# Altium footprint library PCBLIB.PcbLib: 775 footprints (part 10 of 49)
Each footprint in its own frame and in the unit in brackets; x right, y up, seen from the top. Pads: shape width x height; smd on the part's side, far side on the other; paste and mask are expansions set on the pad; w line width, h text height; cw(c..) or ccw(c..) is an arc to the next point about the centre after c.
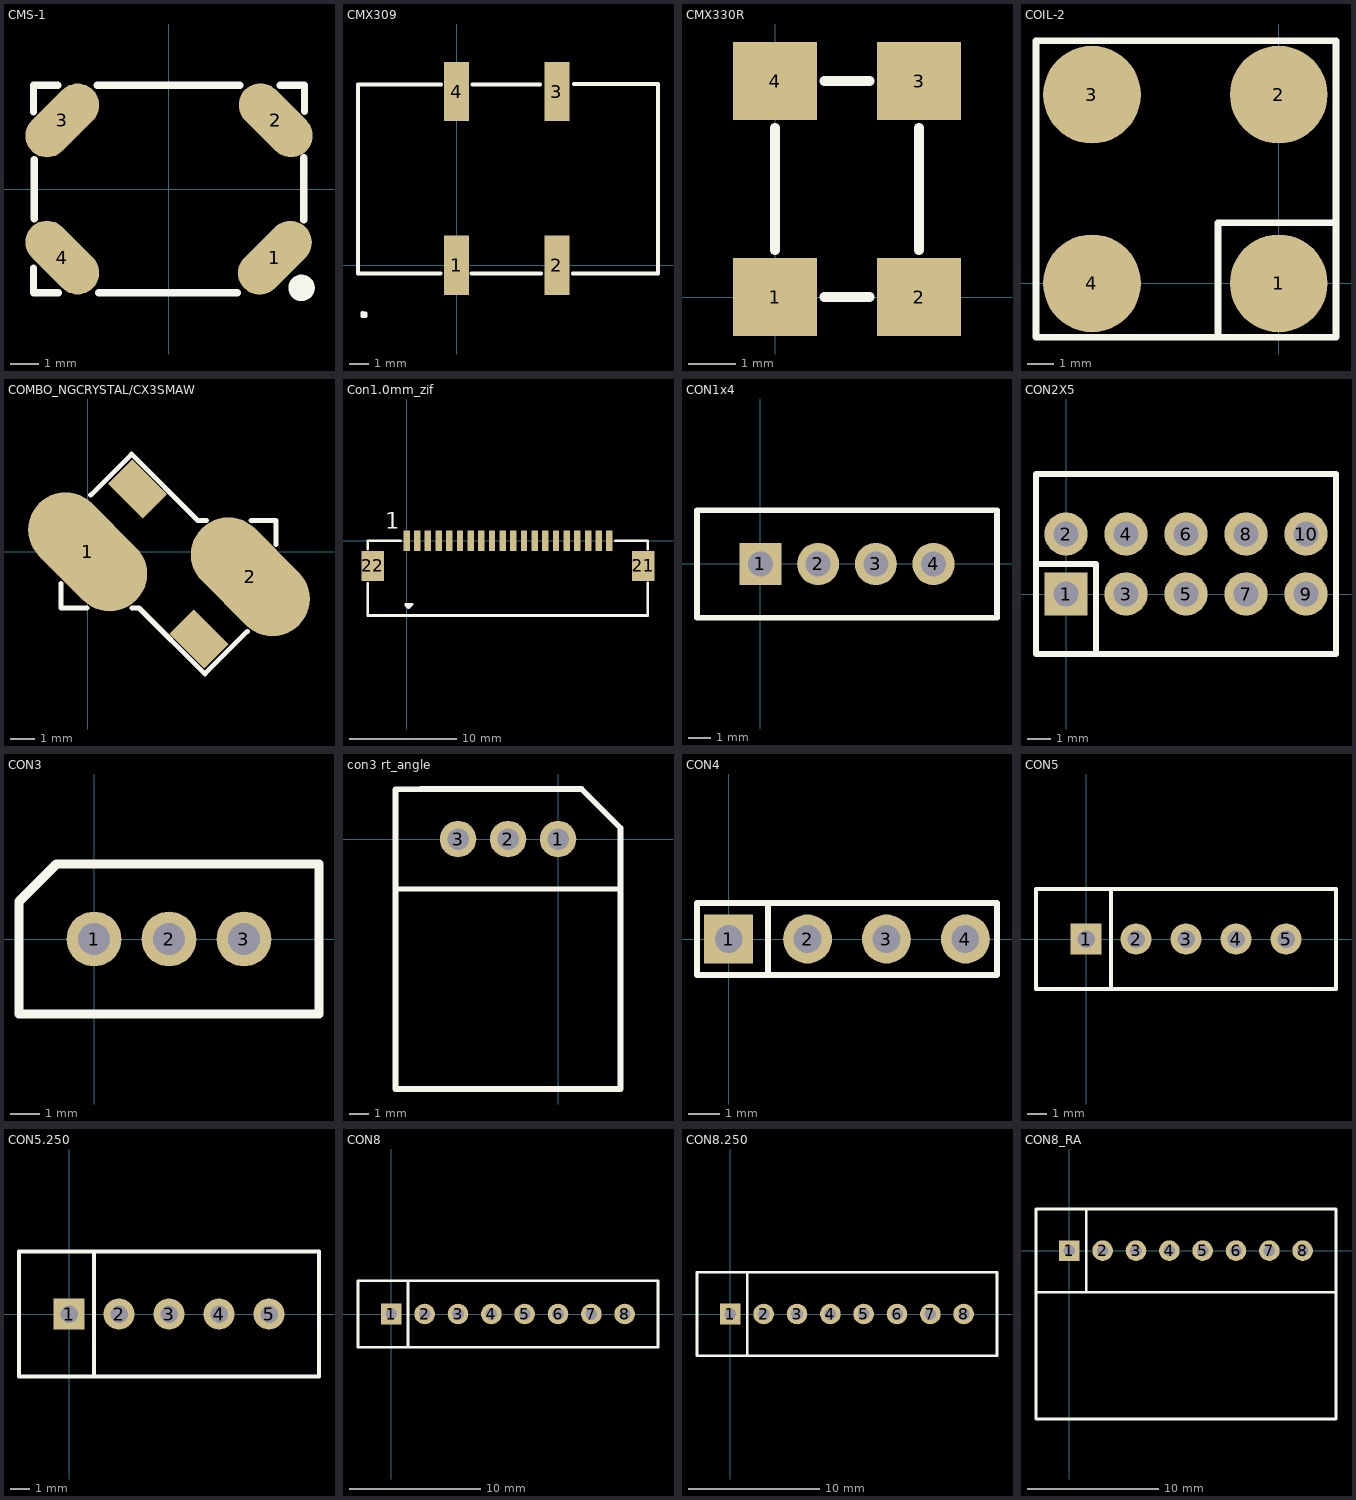
[diagram p9: the footprints below, top view; thin cyan lines are the x and y axes]

## CMS-1 [mm]
height 2.6
pads (4):
  oval 3x1.5 smd rot 45: 1(3.673,-2.383) 3(-3.702,2.376)
  oval 1.5x3 smd rot 45: 2(3.702,2.383)
  oval 3x1.5 smd rot 135: 4(-3.702,-2.376)
TopOverlay:
  circle w0.457: c4.596,-3.429 r0.23
  lines w0.254: -4.7,-2.742 -4.7,-3.6 -3.835,-3.6 ; -4.7,2.668 -4.7,3.6 -3.861,3.6 ; -4.674,-1.041 -4.674,1.016 ; -2.489,3.6 2.464,3.6 ; -2.438,-3.6 2.362,-3.6 ; 3.861,3.6 4.7,3.6 4.7,2.691 ; 4.674,-1.067 4.674,1.092

## CMX309 [mm]
height 4.06
pads (4):
  rect 1.27x3 smd: 1(0,0) 2(5.08,0) 3(5.08,8.8) 4(0,8.8)
TopOverlay:
  lines w0.203: -4.779,-2.425 -4.779,-2.571 -4.618,-2.571 -4.618,-2.439 -4.764,-2.439 ; -0.825,-0.416 -4.998,-0.416 -4.998,9.169 -0.797,9.169 ; 0.748,-0.414 4.271,-0.414 ; 0.806,9.169 4.227,9.169 ; 5.902,-0.407 10.207,-0.407 10.207,9.184 5.938,9.184

## CMX330R [mil] "Common mode choke"
height 65
pads (4):
  rect 70x65 smd: 1(0,0) 2(120,0) 3(120,180) 4(0,180)
TopOverlay:
  lines w8: 0,39 0,141 ; 41,0 79,0 ; 41,180 79,180 ; 120,39 120,141
  text "." at -50,-28 h50

## COIL-2 [mil]
height 240
pads (4):
  round 145 smd: 1(0,0) 2(0,280) 3(-277,280) 4(-277,0)
TopOverlay:
  lines w10: -90.04,-80.01 -90.04,89.99 84.96,89.99 ; 82.96,-80.01 -360.04,-80.01 -360.04,359.99 84.96,359.99 84.96,-80.01
Mechanical4:
  text ".220" at 0,0 h1
  text ".220" at -0.04,-0.01 h1

## COMBO_NGCRYSTAL/CX3SMAW [mil]
pads (4):
  oval 220x120 smd rot 135: 1(0,0) 2(261,-40)
  rect 55x79 smd rot 45: ""(79.78,100.64) ""(178.78,-139.78)
TopOverlay:
  lines w8: -43,-51 -43,-90 -1,-90 ; 5,90.91 70.59,156.5 177.09,50 191,50 ; 71,-90 82.33,-90 187.97,-195.64 256,-127.61 ; 262,50 302,50 302,12
Mechanical4:
  text ".068" at 12,-20 h1

## Con1.0mm_zif [mm]
height 2.7
pads (22):
  rect 0.6x1.9 smd: 1(0,0) 2(1,0) 3(2,0) 4(3,0) 5(4,0) 6(5,0) 7(6,0) 8(7,0) 9(8,0) 10(9,0) 11(10,0) 12(11,0) 13(12,0) 14(13,0) 15(14,0) 16(15,0) 17(16,0) 18(17,0) 19(18,0) 20(19,0)
  rect 2.1x2.8 smd: 21(22.15,-2.35) 22(-3.15,-2.35)
TopOverlay:
  lines w0.254: -3.65,-3.98 -3.65,-7 22.599,-7 22.599,-3.944 ; -3.65,-0.78 -3.65,0 -0.559,0 ; -0.076,-5.994 0.203,-6.274 0.203,-6.248 0.508,-5.944 -0.076,-5.944 ; 19.558,0 22.599,0 22.599,-0.755
  text "1" at -1.981,1.143 h1.52
Mechanical4:
  text ".031" at 0,0 h0.03

## CON1x4 [mil]
height 300
pads (4):
  rect 73x73 hole 43: 1(0,0)
  round 73 hole 43: 2(100,0) 3(200,0) 4(300,0)
TopOverlay:
  lines w10: -110,-93 -110,93 410,93 410,-93 -110,-93

## CON2X5 [mil]
height 250
pads (10):
  rect 72x72 hole 42: 1(0,0)
  round 72 hole 42: 2(0,100) 3(100,0) 4(100,100) 5(200,0) 6(200,100) 7(300,0) 8(300,100) 9(400,0) 10(400,100)
TopOverlay:
  lines w10: -50,50 50,50 50,-99 ; -50,-100 -50,200 450,200 450,-100 -50,-100
Mechanical4:
  text ".341" at 0,0 h1
  text ".341" at -0.27,0 h1

## CON3 [mil]
height 390
pads (3):
  round 73 hole 43: 1(0,0) 2(100,0) 3(200,0)
TopOverlay:
  lines w12: -100,-100 -100,50 -50,100 300,100 300,-100 -100,-100
Mechanical4:
  text ".400" at 0,0 h1

## con3 rt_angle [mil] "right angle antenna connector"
height 225
pads (3):
  round 73 hole 43: 1(0,0) 2(-100,0) 3(-200,0)
TopOverlay:
  lines w10: -324,-100 125,-100 ; 47,100 125,22
  lines w12: -325,-500 125,-500 125,22 47,100 -275,100 -325,99 -325,50 -325,-500
Mechanical4:
  text ".400" at -200,0 h1

## CON4 [mil]
height 390
pads (4):
  rect 62x62 hole 35: 1(0,0)
  round 62 hole 35: 2(100,0) 3(200,0) 4(300,0)
TopOverlay:
  lines w8: 50,-45.5 50,45.5 ; -40,-45.5 -40,45.5 340,45.5 340,-45.5 -40,-45.5
Mechanical4:
  text ".358" at 0,-1 h1
  text ".300" at 0,0 h1

## CON5 [mil]
height 390
pads (5):
  rect 62x62 hole 35: 1(0,0)
  round 62 hole 35: 2(100,0) 3(200,0) 4(300,0) 5(400,0)
TopOverlay:
  lines w8: 50,-100 50,100 ; -100,-100 -100,100 500,100 500,-100 -100,-100
Mechanical4:
  text ".358" at 0,-1 h1
  text ".300" at 0,0 h1

## CON5.250 [mil]
pads (5):
  rect 62x62 hole 35: 1(0,0)
  round 62 hole 35: 2(100,0) 3(200,0) 4(300,0) 5(400,0)
TopOverlay:
  lines w8: 50,-125 50,125 ; -100,-125 -100,125 500,125 500,-125 -100,-125

## CON8 [mil]
height 390
pads (8):
  rect 62x62 hole 35: 1(0,0)
  round 62 hole 35: 2(100,0) 3(200,0) 4(300,0) 5(400,0) 6(500,0) 7(600,0) 8(700,0)
TopOverlay:
  lines w8: 50,-100 50,100 ; -100,-100 800,-100 800,100 -100,100 -100,-100
Mechanical4:
  text ".300" at 0,0 h1
  text ".358" at 0,-1 h1

## CON8.250 [mil]
pads (8):
  rect 62x62 hole 35: 1(0,0)
  round 62 hole 35: 2(100,0) 3(200,0) 4(300,0) 5(400,0) 6(500,0) 7(600,0) 8(700,0)
TopOverlay:
  lines w8: 51,-125 51,125 ; -100,-125 -100,125 800,125 800,-125 -100,-125

## CON8_RA [mil]
height 100
pads (8):
  rect 62x62 hole 35: 1(0,0)
  round 62 hole 35: 2(100,0) 3(200,0) 4(300,0) 5(400,0) 6(500,0) 7(600,0) 8(700,0)
TopOverlay:
  lines w8: -100,-125 800,-125 ; 51,-125 51,125 ; -100,-505 800,-505 800,125 -100,125 -100,-505